# Altium integrated library BS_Altium_Lib.IntLib: 1016 symbols (part 8 of 8)
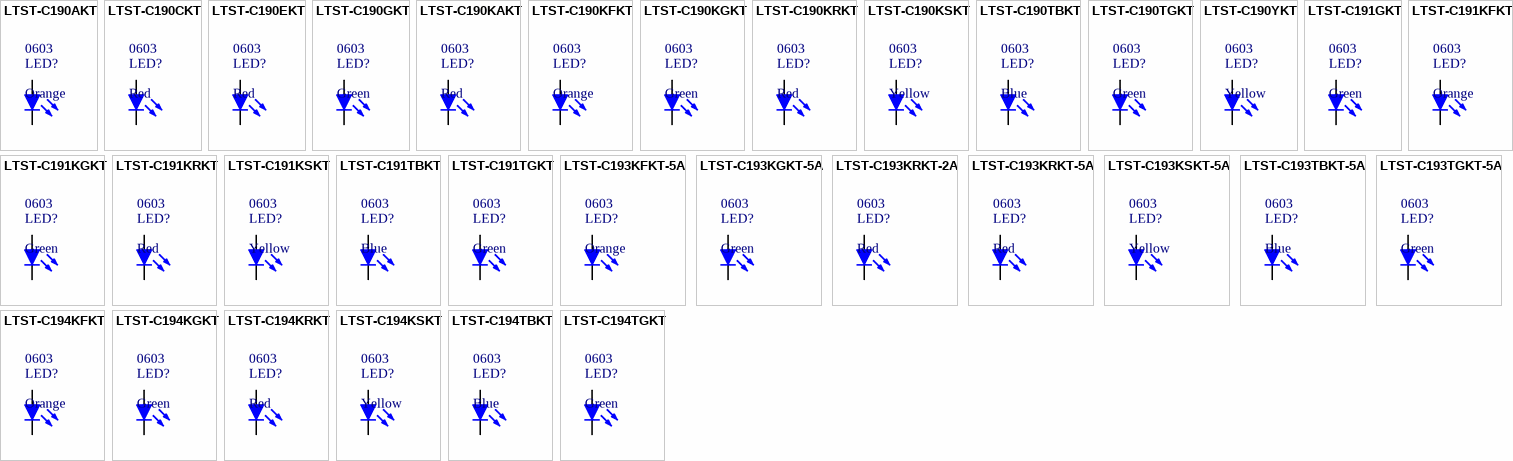
[diagram p66: symbols LTST-C190AKT to LTST-C194TGKT]

## LTST-C193KGKT-5A
designator LED?, comment Green  Package: 0603
LED GREEN CLEAR 0603 SMD; Manufacturer: Lite-On Inc.; Manufacturer Part Number: LTST-C193KGKT-5A; Lens Color: Colorless; Millicandela Rating: 16.25mcd; Lens Style/Size: Rectangle with Flat Top, 1.15mm x 0.80mm; Voltage - Forward (Vf) (Typ): 2V; Current - Test: 5mA; Viewing Angle: 130°; Wavelength - Dominant: 572nm; Wavelength - Peak: 574nm; Supplier 1: Digi-Key; Supplier Part Number 1: 160-1828-1-ND; RoHS: RoHS Compliant; Category: Optoelectronics; Stock 1: 152539; Pricing 1: 1=0.41, 10=0.296, 25=0.2268, 100=0.148, 250=0.10852, 500=0.0921, 1000=0.07565 (USD); Packaging: Cut Tape (CT); Part Status: Active; Color: Green; Lens Transparency: Clear; Mounting Type: Surface Mount; Features: -; Supplier Device Package: Chip LED; Size / Dimension: 1.60mm L x 0.80mm W; Height (Max): 0.45mm; ComponentLink1URL: http://optoelectronics.liteon.com/upload/download/DS22-2007-0094/S_110_LTST-C193KGKT-5A.pdf; ComponentLink1Description: http://optoelectronics.liteon.com/upload/download/DS22-2007-0094/S_110_LTST-C193KGKT-5A.pdf
footprint Led 0603 - green (Led SMD 0603)
pins: 1 A, 2 K

## LTST-C193KRKT-2A
designator LED?, comment Red  Package: 0603
LED RED CLEAR 0603 SMD; Manufacturer: Lite-On Inc.; Manufacturer Part Number: LTST-C193KRKT-2A; Lens Color: Colorless; Millicandela Rating: 6.5mcd; Lens Style/Size: Rectangle with Flat Top, 1.15mm x 0.80mm; Voltage - Forward (Vf) (Typ): 1.9V; Current - Test: 2mA; Viewing Angle: 130°; Wavelength - Dominant: 629nm; Wavelength - Peak: 639nm; Supplier 1: Digi-Key; Supplier Part Number 1: 160-1909-1-ND; RoHS: RoHS Compliant; Category: Optoelectronics; Stock 1: 12161; Pricing 1: 1=0.51, 10=0.366, 25=0.2808, 100=0.1832, 250=0.13432, 500=0.11396, 1000=0.09361 (USD); Packaging: Cut Tape (CT); Part Status: Active; Color: Red; Lens Transparency: Clear; Mounting Type: Surface Mount; Features: -; Supplier Device Package: Chip LED; Size / Dimension: 1.60mm L x 0.80mm W; Height (Max): 0.35mm; ComponentLink1URL: http://media.digikey.com/pdf/Data%20Sheets/Lite-On%20PDFs/LTST-C193KRKT-2A.pdf; ComponentLink1Description: http://media.digikey.com/pdf/Data%20Sheets/Lite-On%20PDFs/LTST-C193KRKT-2A.pdf
footprint Led 0603 - red (Led SMD 0603)
pins: 1 A, 2 K

## LTST-C193KRKT-5A
designator LED?, comment Red  Package: 0603
LED RED CLEAR 0603 SMD; Manufacturer: Lite-On Inc.; Manufacturer Part Number: LTST-C193KRKT-5A; Lens Color: Colorless; Millicandela Rating: 26.05mcd; Lens Style/Size: Rectangle with Flat Top, 1.15mm x 0.80mm; Voltage - Forward (Vf) (Typ): 2V; Current - Test: 5mA; Viewing Angle: 130°; Wavelength - Dominant: 631nm; Wavelength - Peak: 639nm; Supplier 1: Digi-Key; Supplier Part Number 1: 160-1830-1-ND; RoHS: RoHS Compliant; Category: Optoelectronics; Stock 1: 88243; Pricing 1: 1=0.41, 10=0.296, 25=0.2268, 100=0.148, 250=0.10852, 500=0.0921, 1000=0.07565 (USD); Packaging: Cut Tape (CT); Part Status: Active; Color: Red; Lens Transparency: Clear; Mounting Type: Surface Mount; Features: -; Supplier Device Package: Chip LED; Size / Dimension: 1.60mm L x 0.80mm W; Height (Max): 0.45mm; ComponentLink1URL: http://optoelectronics.liteon.com/upload/download/DS22-2005-077/S_110_LTST-C193KRKT-5A.pdf; ComponentLink1Description: http://optoelectronics.liteon.com/upload/download/DS22-2005-077/S_110_LTST-C193KRKT-5A.pdf
footprint Led 0603 - red (Led SMD 0603)
pins: 1 A, 2 K

## LTST-C193KSKT-5A
designator LED?, comment Yellow  Package: 0603
LED YELLOW CLEAR 0603 SMD; Manufacturer: Lite-On Inc.; Manufacturer Part Number: LTST-C193KSKT-5A; Lens Color: Colorless; Millicandela Rating: 26.05mcd; Lens Style/Size: Rectangle with Flat Top, 1.15mm x 0.80mm; Voltage - Forward (Vf) (Typ): 2V; Current - Test: 5mA; Viewing Angle: 130°; Wavelength - Dominant: 591nm; Supplier 1: Digi-Key; Supplier Part Number 1: 160-1831-1-ND; RoHS: RoHS Compliant; Category: Optoelectronics; Stock 1: 43558; Pricing 1: 1=0.41, 10=0.296, 25=0.2268, 100=0.148, 250=0.10852, 500=0.0921, 1000=0.07565 (USD); Packaging: Cut Tape (CT); Part Status: Active; Color: Yellow; Lens Transparency: Clear; Mounting Type: Surface Mount; Wavelength - Peak: 591nm; Features: -; Supplier Device Package: Chip LED; Size / Dimension: 1.60mm L x 0.80mm W; Height (Max): 0.45mm; ComponentLink1URL: http://optoelectronics.liteon.com/upload/download/DS22-2004-141/S_110_LTST-C193KSKT-5A.pdf; ComponentLink1Description: http://optoelectronics.liteon.com/upload/download/DS22-2004-141/S_110_LTST-C193KSKT-5A.pdf
footprint Led 0603 - yellow (Led SMD 0603)
pins: 1 A, 2 K

## LTST-C193TBKT-5A
designator LED?, comment Blue  Package: 0603
LED BLUE CLEAR 0603 SMD; Manufacturer: Lite-On Inc.; Manufacturer Part Number: LTST-C193TBKT-5A; Lens Color: Colorless; Millicandela Rating: 15mcd; Lens Style/Size: Rectangle with Flat Top, 1.15mm x 0.80mm; Voltage - Forward (Vf) (Typ): 2.8V; Current - Test: 5mA; Viewing Angle: 130°; Wavelength - Dominant: 470nm; Wavelength - Peak: 468nm; Supplier 1: Digi-Key; Supplier Part Number 1: 160-1827-1-ND; RoHS: RoHS Compliant; Category: Optoelectronics; Stock 1: 636289; Pricing 1: 1=0.47, 10=0.336, 25=0.2572, 100=0.1678, 250=0.12304, 500=0.10442, 1000=0.08577 (USD); Packaging: Cut Tape (CT); Part Status: Active; Color: Blue; Lens Transparency: Clear; Mounting Type: Surface Mount; Features: -; Supplier Device Package: Chip LED; Size / Dimension: 1.60mm L x 0.80mm W; Height (Max): 0.45mm; ComponentLink1URL: http://optoelectronics.liteon.com/upload/download/DS22-2004-060/P_100_LTST-C193TBKT-5A.pdf; ComponentLink1Description: http://optoelectronics.liteon.com/upload/download/DS22-2004-060/P_100_LTST-C193TBKT-5A.pdf
footprint Led 0603 - blue (Led SMD 0603)
pins: 1 A, 2 K

## LTST-C193TGKT-5A
designator LED?, comment Green  Package: 0603
LED GREEN CLEAR 0603 SMD; Manufacturer: Lite-On Inc.; Manufacturer Part Number: LTST-C193TGKT-5A; Lens Color: Colorless; Millicandela Rating: 154mcd; Lens Style/Size: Rectangle with Flat Top, 1.15mm x 0.80mm; Voltage - Forward (Vf) (Typ): 2.8V; Current - Test: 5mA; Viewing Angle: 130°; Wavelength - Dominant: 528nm; Wavelength - Peak: 525nm; Supplier 1: Digi-Key; Supplier Part Number 1: 160-1832-1-ND; RoHS: RoHS Compliant; Category: Optoelectronics; Stock 1: 80659; Pricing 1: 1=0.51, 10=0.37, 25=0.302, 100=0.2415, 250=0.20376, 500=0.17356, 1000=0.13583 (USD); Packaging: Cut Tape (CT); Part Status: Active; Color: Green; Lens Transparency: Clear; Mounting Type: Surface Mount; Features: -; Supplier Device Package: Chip LED; Size / Dimension: 1.60mm L x 0.80mm W; Height (Max): 0.45mm; ComponentLink1URL: http://optoelectronics.liteon.com/upload/download/DS22-2004-186/P_100_LTST-C193TGKT-5A.pdf; ComponentLink1Description: http://optoelectronics.liteon.com/upload/download/DS22-2004-186/P_100_LTST-C193TGKT-5A.pdf
footprint Led 0603 - green (Led SMD 0603)
pins: 1 A, 2 K

## LTST-C194KFKT
designator LED?, comment Orange  Package: 0603
LED ORANGE CLEAR 0603 SMD; Manufacturer: Lite-On Inc.; Manufacturer Part Number: LTST-C194KFKT; Lens Color: Colorless; Millicandela Rating: 162.5mcd; Lens Style/Size: Rectangle with Flat Top, 1.15mm x 0.80mm; Voltage - Forward (Vf) (Typ): 2V; Current - Test: 20mA; Viewing Angle: 130°; Wavelength - Dominant: 605nm; Wavelength - Peak: 611nm; Supplier 1: Digi-Key; Supplier Part Number 1: 160-1833-1-ND; RoHS: RoHS Compliant; Category: Optoelectronics; Stock 1: 32905; Pricing 1: 1=0.41, 10=0.296, 25=0.2268, 100=0.148, 250=0.10852, 500=0.0921, 1000=0.07565 (USD); Packaging: Cut Tape (CT); Part Status: Active; Color: Orange; Lens Transparency: Clear; Mounting Type: Surface Mount; Features: -; Size / Dimension: 1.60mm L x 0.80mm W; Height (Max): 0.45mm; ComponentLink1URL: http://optoelectronics.liteon.com/upload/download/DS22-2010-0196/S_110_LTST-C194KFKT.pdf; ComponentLink1Description: http://optoelectronics.liteon.com/upload/download/DS22-2010-0196/S_110_LTST-C194KFKT.pdf
footprint Led 0603 - orange (Led SMD 0603)
pins: 1 A, 2 K

## LTST-C194KGKT
designator LED?, comment Green  Package: 0603
LED GREEN CLEAR 0603 SMD; Manufacturer: Lite-On Inc.; Manufacturer Part Number: LTST-C194KGKT; Lens Color: Colorless; Millicandela Rating: 65mcd; Lens Style/Size: Rectangle with Flat Top, 1.15mm x 0.80mm; Voltage - Forward (Vf) (Typ): 2.1V; Current - Test: 20mA; Viewing Angle: 130°; Wavelength - Dominant: 572nm; Wavelength - Peak: 574nm; Supplier 1: Digi-Key; Supplier Part Number 1: 160-1834-1-ND; RoHS: RoHS Compliant; Category: Optoelectronics; Stock 1: 34911; Pricing 1: 1=0.41, 10=0.296, 25=0.2268, 100=0.148, 250=0.10852, 500=0.0921, 1000=0.07565 (USD); Packaging: Cut Tape (CT); Part Status: Active; Color: Green; Lens Transparency: Clear; Mounting Type: Surface Mount; Features: -; Size / Dimension: 1.60mm L x 0.80mm W; Height (Max): 0.45mm; ComponentLink1URL: http://optoelectronics.liteon.com/upload/download/DS22-2010-0197/S_110_LTST-C194KGKT.pdf; ComponentLink1Description: http://optoelectronics.liteon.com/upload/download/DS22-2010-0197/S_110_LTST-C194KGKT.pdf
footprint Led 0603 - green (Led SMD 0603)
pins: 1 A, 2 K

## LTST-C194KRKT
designator LED?, comment Red  Package: 0603
LED RED CLEAR 0603 SMD; Manufacturer: Lite-On Inc.; Manufacturer Part Number: LTST-C194KRKT; Lens Color: Colorless; Millicandela Rating: 95.6mcd; Lens Style/Size: Rectangle with Flat Top, 1.15mm x 0.80mm; Voltage - Forward (Vf) (Typ): 2V; Current - Test: 20mA; Viewing Angle: 130°; Wavelength - Dominant: 631nm; Wavelength - Peak: 639nm; Supplier 1: Digi-Key; Supplier Part Number 1: 160-1835-1-ND; RoHS: RoHS Compliant; Category: Optoelectronics; Stock 1: 44539; Pricing 1: 1=0.41, 10=0.296, 25=0.2268, 100=0.148, 250=0.10852, 500=0.0921, 1000=0.07565 (USD); Packaging: Cut Tape (CT); Part Status: Active; Color: Red; Lens Transparency: Clear; Mounting Type: Surface Mount; Features: -; Size / Dimension: 1.60mm L x 0.80mm W; Height (Max): 0.45mm; ComponentLink1URL: http://optoelectronics.liteon.com/upload/download/DS22-2010-0195/S_110_LTST-C194KRKT.pdf; ComponentLink1Description: http://optoelectronics.liteon.com/upload/download/DS22-2010-0195/S_110_LTST-C194KRKT.pdf
footprint Led 0603 - red (Led SMD 0603)
pins: 1 A, 2 K

## LTST-C194KSKT
designator LED?, comment Yellow  Package: 0603
LED YELLOW CLEAR 0603 SMD; Manufacturer: Lite-On Inc.; Manufacturer Part Number: LTST-C194KSKT; Lens Color: Colorless; Millicandela Rating: 104mcd; Lens Style/Size: Rectangle with Flat Top, 1.15mm x 0.80mm; Voltage - Forward (Vf) (Typ): 2V; Current - Test: 20mA; Viewing Angle: 130°; Wavelength - Dominant: 592nm; Wavelength - Peak: 588nm; Supplier 1: Digi-Key; Supplier Part Number 1: 160-1836-1-ND; RoHS: RoHS Compliant; Category: Optoelectronics; Stock 1: 12944; Pricing 1: 1=0.41, 10=0.296, 25=0.2268, 100=0.148, 250=0.10852, 500=0.0921, 1000=0.07565 (USD); Packaging: Cut Tape (CT); Part Status: Active; Color: Yellow; Lens Transparency: Clear; Mounting Type: Surface Mount; Features: -; Size / Dimension: 1.60mm L x 0.80mm W; Height (Max): 0.45mm; ComponentLink1URL: http://optoelectronics.liteon.com/upload/download/DS22-2006-114/S_110_LTST-C194KSKT.pdf; ComponentLink1Description: http://optoelectronics.liteon.com/upload/download/DS22-2006-114/S_110_LTST-C194KSKT.pdf
footprint Led 0603 - yellow (Led SMD 0603)
pins: 1 A, 2 K

## LTST-C194TBKT
designator LED?, comment Blue  Package: 0603
LED BLUE CLEAR 0603 SMD; Manufacturer: Lite-On Inc.; Manufacturer Part Number: LTST-C194TBKT; Lens Color: Colorless; Millicandela Rating: 104mcd; Lens Style/Size: Rectangle with Flat Top, 1.15mm x 0.80mm; Voltage - Forward (Vf) (Typ): 3.3V; Current - Test: 20mA; Viewing Angle: 130°; Wavelength - Dominant: 468nm; Supplier 1: Digi-Key; Supplier Part Number 1: 160-1837-1-ND; RoHS: RoHS Compliant; Category: Optoelectronics; Stock 1: 101348; Pricing 1: 1=0.47, 10=0.336, 25=0.2572, 100=0.1678, 250=0.12304, 500=0.10442, 1000=0.08577 (USD); Packaging: Cut Tape (CT); Part Status: Active; Color: Blue; Lens Transparency: Clear; Mounting Type: Surface Mount; Wavelength - Peak: 468nm; Features: -; Size / Dimension: 1.60mm L x 0.80mm W; Height (Max): 0.45mm; ComponentLink1URL: http://optoelectronics.liteon.com/upload/download/DS22-2010-0025/S_110_LTST-C194TBKT.pdf; ComponentLink1Description: http://optoelectronics.liteon.com/upload/download/DS22-2010-0025/S_110_LTST-C194TBKT.pdf
footprint Led 0603 - blue (Led SMD 0603)
pins: 1 A, 2 K

## LTST-C194TGKT
designator LED?, comment Green  Package: 0603
LED GREEN CLEAR 0603 SMD; Manufacturer: Lite-On Inc.; Manufacturer Part Number: LTST-C194TGKT; Lens Color: Colorless; Millicandela Rating: 260.5mcd; Lens Style/Size: Rectangle with Flat Top, 1.15mm x 0.80mm; Voltage - Forward (Vf) (Typ): 3.2V; Current - Test: 20mA; Viewing Angle: 130°; Wavelength - Dominant: 525nm; Wavelength - Peak: 530nm; Supplier 1: Digi-Key; Supplier Part Number 1: 160-1838-1-ND; RoHS: RoHS Compliant; Category: Optoelectronics; Stock 1: 19301; Pricing 1: 1=0.51, 10=0.37, 25=0.302, 100=0.2415, 250=0.20376, 500=0.17356, 1000=0.13583 (USD); Packaging: Cut Tape (CT); Part Status: Active; Color: Green; Lens Transparency: Clear; Mounting Type: Surface Mount; Features: -; Size / Dimension: 1.60mm L x 0.80mm W; Height (Max): 0.45mm; ComponentLink1URL: http://optoelectronics.liteon.com/upload/download/DS22-2010-0023/S_110_LTST-C194TGKT.pdf; ComponentLink1Description: http://optoelectronics.liteon.com/upload/download/DS22-2010-0023/S_110_LTST-C194TGKT.pdf
footprint Led 0603 - green (Led SMD 0603)
pins: 1 A, 2 K


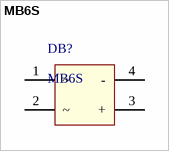
[diagram p48: symbol MB6S]

## MB6S
designator DB?
IC RECT BRIDGE 0.5A 600V 4SOIC; Manufacturer: Fairchild Semiconductor; Diode Type: Single Phase; Current - DC Forward (If) (Max): 500mA; Max Surge Current: 35 A; Ir - Reverse Current: 5 uA; Pd - Power Dissipation: 1.4 W; Vf - Forward Voltage: 1 V; Vr - Reverse Voltage: 420 V; Supplier 1: Digi-Key; Manufacturer Part Number: MB6S; RoHS: RoHS Compliant; Category: Discrete Semiconductor Products; Stock 1: 21407; Pricing 1: 1=0.38, 10=0.305, 100=0.2079, 500=0.15562, 1000=0.11655 (USD); Packaging: Cut Tape (CT); Part Status: Active; Voltage - Peak Reverse (Max): 600V; Mounting Type: Surface Mount; Package / Case: TO-269AA, 4-BESOP; Operating Temperature: -55°C ~ 150°C (TJ); Supplier Device Package: 4-SOIC; ComponentLink1URL: https://www.fairchildsemi.com/datasheets/MB/MB1S.pdf; ComponentLink1Description: https://www.fairchildsemi.com/datasheets/MB/MB1S.pdf; Supplier 2: Mouser; Stock 2: 17482; Pricing 2: 1=0.360, 10=0.279, 100=0.151, 1000=0.113, 3000=0.098, 9000=0.091, 24000=0.084, 45000=0.080, 99000=0.076 (USD); Height: 2.7 mm; Length: 4.9 mm; Product: Bridge Rectifiers; Series: MB6S; Termination Style: SMD/SMT; Type: Single Phase Bridge; Width: 4.2 mm; Brand: Fairchild Semiconductor; Mounting Style: PCB Mount; If - Forward Current: 0.5 A; Maximum Operating Temperature: + 150 C; Minimum Operating Temperature: - 55 C; Peak Reverse Voltage: 600 V; Standard Pack Qty: 3000; RoHS - Mouser: E; Minimum Order Quantity: 1; Reeling: True; ComponentLink2URL: http://www.mouser.com/ds/2/149/MB6S-1011197.pdf; ComponentLink2Description: http://www.mouser.com/ds/2/149/MB6S-1011197.pdf; Supplier Part Number 1: MB6SCT-ND; Supplier Part Number 2: 512-MB6S
footprint SOIC-4 DB (SOIC-4 Diodes Bridge)
pins: 1 ~, 2 ~, 3 +, 4 -


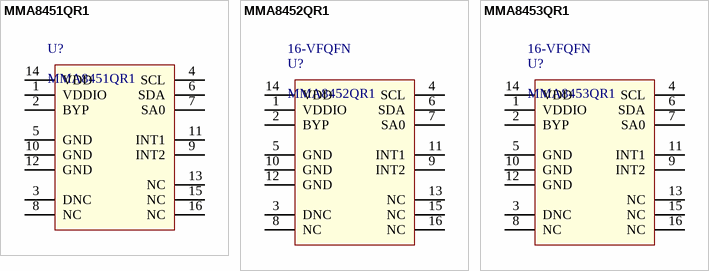
[diagram p49: symbols MMA8451QR1 to MMA8453QR1]

## MMA8451QR1
designator U?
ACCELEROMETER 2-8G I2C 16QFN; Manufacturer: NXP USA Inc.; Axis: X, Y, Z; Acceleration Range: ±2g, 4g, 8g; Sensitivity (LSB/g): 4096 (±2g) ~ 1024 (±8g); Bandwidth: 0.78Hz ~ 400Hz; Output Type: I²C; Voltage - Supply: 1.95 V ~ 3.6 V; Supplier 1: Digi-Key; Supplier Part Number 1: MMA8451QR1CT-ND; Manufacturer Part Number: MMA8451QR1; RoHS: RoHS Compliant; Category: Sensors, Transducers; Stock 1: 45561; Pricing 1: 1=2.65, 5=2.502, 10=2.145, 25=1.716, 50=1.573, 100=1.43, 500=1.25126 (USD); Packaging: Cut Tape (CT); Part Status: Active; Type: Digital; Sensitivity (mV/g): -; Features: Adjustable Bandwidth, Selectable Scale, Sleep Mode; Operating Temperature: -40°C ~ 85°C (TA); Mounting Type: Surface Mount; Supplier Device Package: 16-QFN (3x3); ComponentLink1URL: http://cache.freescale.com/files/sensors/doc/data_sheet/MMA8451Q.pdf; ComponentLink1Description: http://cache.freescale.com/files/sensors/doc/data_sheet/MMA8451Q.pdf; Package: 16-VFQFN
footprint QFN-16 MMA845xQ (QFN, 16-Leads, Body 3.0x3.0mm (max), Pitch 0.50mm, IPC Low Density)
pins: 1 VDDIO "Internal power supply (1.62 V to 3.6 V)", 2 BYP "Bypass capacitor (0.1 mF)", 3 DNC "Do not connect to anything, leave pin isolated and floating.", 4 SCL "I2C serial clock, open drain", 5 GND "Connect to ground", 6 SDA "I2C serial data", 7 SA0 "I2C least significant bit of the device I2C address, I2C 7-bit address = 0x1C (SA0 = 0), 0x1D (SA0 = 1).", 8 NC "Internally not connected", 9 INT2 "Inertial interrupt 2, output pin", 10 GND "Connect to ground", 11 INT1 "Inertial interrupt 1, output pin", 12 GND "Connect to ground", 13 NC "Internally not connected", 14 VDD "Power supply (1.95 V to 3.6 V)", 15 NC "Internally not connected", 16 NC "Internally not connected (can be GND or VDD)"

## MMA8452QR1
designator U?  Package: 16-VFQFN
ACCELEROMETER 2-8G I2C 16QFN; Manufacturer: NXP USA Inc.; Axis: X, Y, Z; Acceleration Range: ±2g, 4g, 8g; Sensitivity (LSB/g): 1024 (±2g) ~ 256 (±8g); Bandwidth: 0.78Hz ~ 400Hz; Output Type: I²C; Voltage - Supply: 1.95 V ~ 3.6 V; Supplier 1: Digi-Key; Supplier Part Number 1: MMA8452QR1CT-ND; Manufacturer Part Number: MMA8452QR1; RoHS: RoHS Compliant; Category: Sensors, Transducers; Stock 1: 40000; Pricing 1: 1=2.08, 5=1.964, 10=1.683, 25=1.3464, 50=1.2342, 100=1.122, 500=0.98176 (USD); Packaging: Cut Tape (CT); Part Status: Active; Type: Digital; Sensitivity (mV/g): -; Features: Adjustable Bandwidth, Selectable Scale, Sleep Mode; Operating Temperature: -40°C ~ 85°C (TA); Mounting Type: Surface Mount; Supplier Device Package: 16-QFN (3x3); ComponentLink1URL: http://cache.freescale.com/files/sensors/doc/data_sheet/MMA8452Q.pdf; ComponentLink1Description: http://cache.freescale.com/files/sensors/doc/data_sheet/MMA8452Q.pdf
footprint QFN-16 MMA845xQ (QFN, 16-Leads, Body 3.0x3.0mm (max), Pitch 0.50mm, IPC Low Density)
pins: 1 VDDIO "Internal power supply (1.62 V to 3.6 V)", 2 BYP "Bypass capacitor (0.1 mF)", 3 DNC "Do not connect to anything, leave pin isolated and floating.", 4 SCL "I2C serial clock, open drain", 5 GND "Connect to ground", 6 SDA "I2C serial data", 7 SA0 "I2C least significant bit of the device I2C address, I2C 7-bit address = 0x1C (SA0 = 0), 0x1D (SA0 = 1).", 8 NC "Internally not connected", 9 INT2 "Inertial interrupt 2, output pin", 10 GND "Connect to ground", 11 INT1 "Inertial interrupt 1, output pin", 12 GND "Connect to ground", 13 NC "Internally not connected", 14 VDD "Power supply (1.95 V to 3.6 V)", 15 NC "Internally not connected", 16 NC "Internally not connected (can be GND or VDD)"

## MMA8453QR1
designator U?  Package: 16-VFQFN
ACCELEROMETER 2-8G I2C 16QFN; Manufacturer: NXP USA Inc.; Axis: X, Y, Z; Acceleration Range: ±2g, 4g, 8g; Sensitivity (LSB/g): 256 (±2g) ~ 64 (±8g); Bandwidth: 0.78Hz ~ 400Hz; Output Type: I²C; Voltage - Supply: 1.95 V ~ 3.6 V; Supplier 1: Digi-Key; Supplier Part Number 1: MMA8453QR1CT-ND; Manufacturer Part Number: MMA8453QR1; RoHS: RoHS Compliant; Category: Sensors, Transducers; Stock 1: 8975; Pricing 1: 1=2.08, 5=1.964, 10=1.683, 25=1.3464, 50=1.2342, 100=1.122, 500=0.98176 (USD); Packaging: Cut Tape (CT); Part Status: Active; Type: Digital; Sensitivity (mV/g): -; Features: Adjustable Bandwidth, Selectable Scale, Sleep Mode; Operating Temperature: -40°C ~ 85°C (TA); Mounting Type: Surface Mount; Supplier Device Package: 16-QFN (3x3); ComponentLink1URL: http://cache.freescale.com/files/sensors/doc/data_sheet/MMA8453Q.pdf; ComponentLink1Description: http://cache.freescale.com/files/sensors/doc/data_sheet/MMA8453Q.pdf
footprint QFN-16 MMA845xQ (QFN, 16-Leads, Body 3.0x3.0mm (max), Pitch 0.50mm, IPC Low Density)
pins: 1 VDDIO "Internal power supply (1.62 V to 3.6 V)", 2 BYP "Bypass capacitor (0.1 mF)", 3 DNC "Do not connect to anything, leave pin isolated and floating.", 4 SCL "I2C serial clock, open drain", 5 GND "Connect to ground", 6 SDA "I2C serial data", 7 SA0 "I2C least significant bit of the device I2C address, I2C 7-bit address = 0x1C (SA0 = 0), 0x1D (SA0 = 1).", 8 NC "Internally not connected", 9 INT2 "Inertial interrupt 2, output pin", 10 GND "Connect to ground", 11 INT1 "Inertial interrupt 1, output pin", 12 GND "Connect to ground", 13 NC "Internally not connected", 14 VDD "Power supply (1.95 V to 3.6 V)", 15 NC "Internally not connected", 16 NC "Internally not connected (can be GND or VDD)"


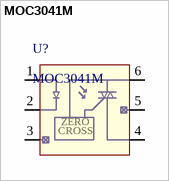
[diagram p50: symbol MOC3041M]

## MOC3041M
designator U?
OPTOISOLATOR 4.17KV TRIAC 6DIP; Manufacturer: ON Semiconductor/Fairchild; Zero Crossing Circuit: Yes; Number of Channels: 1; Voltage - Isolation: 4170Vrms; Voltage - Off State: 400V; Static dV/dt (Min): 1kV/µs; Current - LED Trigger (Ift) (Max): 15mA; Current - Hold (Ih): 400µA (Typ); Voltage - Forward (Vf) (Typ): 1.25V; Current - DC Forward (If) (Max): 60mA; Approvals: UL; Supplier 1: Digi-Key; Supplier Part Number 1: MOC3041M-ND; Manufacturer Part Number: MOC3041M; RoHS: RoHS Compliant; Category: Isolators; Stock 1: 5774; Pricing 1: 1=0.95, 10=0.735, 25=0.6092, 100=0.525, 250=0.462, 500=0.399, 1000=0.315, 2500=0.294, 5000=0.2835 (USD); Packaging: Tube; Part Status: Active; Output Type: Triac; Current - On State (It (RMS)) (Max): -; Turn On Time: -; Operating Temperature: -40°C ~ 85°C; Mounting Type: Through Hole; Package / Case: 6-DIP (0.300", 7.62mm); Supplier Device Package: 6-DIP; ComponentLink1URL: https://www.fairchildsemi.com/datasheets/MO/MOC3042M.pdf; ComponentLink1Description: https://www.fairchildsemi.com/datasheets/MO/MOC3042M.pdf; Supplier 2: Mouser; Supplier Part Number 2: 512-MOC3041-M
footprint DIP-6 White
pins: 1 A, 2 K, 3 NC, 4 T2, 5 NC, 6 T1
text: ZERO; CROSS


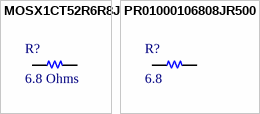
[diagram p51: symbols MOSX1CT52R6R8J to PR01000106808JR500]

## MOSX1CT52R6R8J
designator R?, comment 6.8 Ohms
Metal Oxide Resistors RSS1 6.8 5%TR; Manufacturer: KOA Speer; Manufacturer Part Number: MOSX1CT52R6R8J; Power Rating: 1 W; Temperature Coefficient: 300 PPM / C; Tolerance: 5 %; Qualification: AEC-Q200; Supplier 1: Mouser; Supplier Part Number 1: 660-MOSX1CT52R6R8J; RoHS: RoHS Compliant; Category: Metal Oxide Resistors; Stock 1: 7005; Pricing 1: 1=0.100, 50=0.082, 100=0.075, 500=0.063, 1000=0.056, 4000=0.049, 8000=0.046, 12000=0.040, 20000=0.035 (USD); Diameter: 3 mm; Length: 9 mm; Operating Temperature Range: - 55 C to + 200 C; Packaging: Reel; Product: Power Resistors Metal Oxide; Resistance: 6.8 Ohms; Series: MOS; Termination Style: Axial; Brand: KOA Speer; Standard Pack Qty: 4000; RoHS - Mouser: Y; Minimum Order Quantity: 1; Reeling: True; ComponentLink1URL: http://www.mouser.com/ds/2/219/MOS-16613.pdf; ComponentLink1Description: http://www.mouser.com/ds/2/219/MOS-16613.pdf
footprint Axial_D3.4mm_P4.0mm_straight (Resistors, Axial, , Length 6.5 mm, Diameter 2.5 mm)
pins: 1, 2

## PR01000106808JR500
designator R?, comment 6.8
RES 6.8 OHM 1W 5% AXIAL; Manufacturer: Vishay BC Components; Manufacturer Part Number: PR01000106808JR500; Temperature Coefficient: ±250ppm/°C; Resistance: 6.8 Ohms; Voltage Rating: 350 V; Brand: Vishay / BC Components; Lead Diameter: 0.58 mm; Supplier 1: Digi-Key; RoHS: RoHS Compliant; Category: Resistors; Stock 1: 2328; Pricing 1: 1=0.24, 10=0.206, 25=0.1496, 50=0.1084, 100=0.0804, 250=0.06172, 500=0.04862, 1000=0.03366, 2500=0.03086 (USD); Packaging: Cut Tape (CT); Part Status: Active; Resistance (Ohms): 6.8; Tolerance: ±5%; Power (Watts): 1W; Composition: Metal Film; Features: Automotive AEC-Q200, Flame Retardant Coating, Safety; Operating Temperature: -55°C ~ 155°C; Package / Case: Axial; Supplier Device Package: Axial; Size / Dimension: 0.098" Dia x 0.256" L (2.50mm x 6.50mm); Height: -; Number of Terminations: 2; Failure Rate: -; ComponentLink1URL: http://www.vishay.com/docs/28729/pr010203.pdf; ComponentLink1Description: http://www.vishay.com/docs/28729/pr010203.pdf; Supplier 2: Mouser; Stock 2: 532; Pricing 2: 1=0.180, 100=0.110, 500=0.063, 1000=0.044, 5000=0.025, 10000=0.024, 25000=0.023, 50000=0.022 (USD); Diameter: 2.5 mm; Length: 6.5 mm; Operating Temperature Range: - 55 C to + 155 C; Power Rating: 1 W; Product: Metal Film Resistors - Through Hole; Series: 5073; Termination Style: Axial; Type: Power Metal Film Leaded Resistors; Lead Spacing: -; Standard Pack Qty: 5000; RoHS - Mouser: Y; Minimum Order Quantity: 1; Reeling: True; ComponentLink2URL: http://www.mouser.com/ds/2/427/pr010203-239785.pdf; ComponentLink2Description: http://www.mouser.com/ds/2/427/pr010203-239785.pdf; Supplier Part Number 1: PPC6.8W-1CT-ND; Supplier Part Number 2: 594-5073NW6R800J
footprint Axial_D3.4mm_P4.0mm_straight (Resistors, Axial, , Length 6.5 mm, Diameter 2.5 mm)
pins: 1, 2


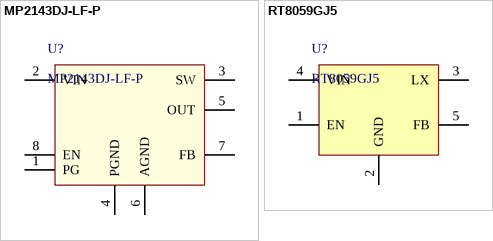
[diagram p52: symbols MP2143DJ-LF-P to RT8059GJ5]

## MP2143DJ-LF-P
designator U?
IC REG BUCK ADJ 3A SYNC; Manufacturer: Monolithic Power Systems Inc.; Function: Step-Down; Output Configuration: Positive; Output Type: Adjustable; Number of Outputs: 1; Voltage - Input (Min): 2.5V; Voltage - Input (Max): 5.5V; Voltage - Output (Min/Fixed): 0.6V; Voltage - Output (Max): 5V; Frequency - Switching: 1.2MHz; Synchronous Rectifier: Yes; Supplier 1: Digi-Key; Supplier Part Number 1: 1589-1080-1-ND; Manufacturer Part Number: MP2143DJ-LF-P; RoHS: RoHS Compliant; Category: Integrated Circuits (ICs); Stock 1: 415; Pricing 1: 1=3.07, 10=2.769, 25=2.472, 100=2.2248, 250=1.9776 (USD); Packaging: Cut Tape (CT); Part Status: Active; Topology: Buck; Current - Output: 3A; Operating Temperature: -40°C ~ 125°C (TJ); Mounting Type: Surface Mount; Supplier Device Package: TSOT-23-8; ComponentLink1URL: https://www.monolithicpower.com/DesktopModules/DocumentManage/API/Document/GetDocument?id=519; ComponentLink1Description: https://www.monolithicpower.com/DesktopModules/DocumentManage/API/Document/GetDocument?id=519; Package: SOT-23-8 Thin, TSOT-23-8
footprint TSOT-23-8
pins: 1 PG "Power-Good Indicator. The pin output is an open drain that connects to VIN by an internal pull-up resistor. PG is pulled up to VIN when the FB voltage is within ±10% of the regulation level. If FB voltage is out of that regulation range, it is LOW.", 2 VIN "Supply Voltage. The MP2143 operates from a 2.5V-to-5.5V unregulated input. C1  prevents large voltage spikes from appearing at the input.", 3 SW "Switch Output", 4 PGND "Power Ground", 5 OUT "Input Sense. For output voltage feedback", 6 AGND "Analog ground. Reference for the internal control circuit.", 7 FB "Feedback pin. Connect an external resistor divider from the output to AGND to set the output voltage.", 8 EN "On/Off Control"

## RT8059GJ5
designator U?
IC REG BUCK ADJ 1A SYNC TSOT23-5; Manufacturer: Richtek USA Inc.; Function: Step-Down; Output Configuration: Positive; Output Type: Adjustable; Number of Outputs: 1; Voltage - Input (Min): 2.8V; Voltage - Input (Max): 5.5V; Voltage - Output (Min/Fixed): 0.6V; Frequency - Switching: 1.5MHz; Synchronous Rectifier: Yes; Supplier 1: Digi-Key; Supplier Part Number 1: 1028-1493-1-ND; Manufacturer Part Number: RT8059GJ5; RoHS: RoHS Compliant; Category: Integrated Circuits (ICs); Stock 1: 2661; Pricing 1: 1=0.92, 10=0.809, 25=0.716, 100=0.6237, 250=0.54284, 500=0.462, 1000=0.3696 (USD); Packaging: Cut Tape (CT); Part Status: Active; Topology: Buck; Voltage - Output (Max): 5.5V; Current - Output: 1A; Operating Temperature: -40°C ~ 85°C (TA); Mounting Type: Surface Mount; Supplier Device Package: TSOT-23-5; ComponentLink1URL: http://www.richtek.com/assets/product_file/RT8059/DS8059-05.pdf; ComponentLink1Description: http://www.richtek.com/assets/product_file/RT8059/DS8059-05.pdf; Package: SOT-23-5 Thin, TSOT-23-5
footprint SOT-23-5 (SOT23, 5-Leads, Body 3.0x3.0mm (max), Pitch 0.95mm, IPC Medium Density)
pins: 1 EN, 2 GND, 3 LX, 4 VIN, 5 FB


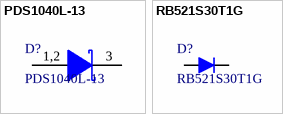
[diagram p53: symbols PDS1040L-13 to RB521S30T1G]

## PDS1040L-13
designator D?
DIODE SCHOTTKY 40V 10A POWERDI5; Manufacturer: Diodes Incorporated; Voltage - Forward (Vf) (Max) @ If: 490mV @ 10A; Speed: Fast Recovery =< 500ns, > 200mA (Io); Current - Reverse Leakage @ Vr: 600µA @ 40V; Configuration: Single Dual Anode; Type: Schottky Barrier Rectifier; Ifsm - Forward Surge Current: 275 A; Ir - Reverse Current: 600 uA; Vf - Forward Voltage: 0.49 V; Supplier 1: Digi-Key; Manufacturer Part Number: PDS1040L-13; RoHS: RoHS Compliant; Category: Discrete Semiconductor Products; Stock 1: 10398; Pricing 1: 1=1.19, 10=1.063, 100=0.8292, 500=0.68496, 1000=0.54075 (USD); Packaging: Cut Tape (CT); Part Status: Active; Diode Type: Schottky; Voltage - DC Reverse (Vr) (Max): 40V; Current - Average Rectified (Io): 10A; Reverse Recovery Time (trr): -; Capacitance @ Vr, F: -; Mounting Type: Surface Mount; Package / Case: PowerDI™ 5; Supplier Device Package: PowerDI™ 5; Operating Temperature - Junction: -65°C ~ 150°C; ComponentLink1URL: http://www.diodes.com/_files/datasheets/ds30486.pdf; ComponentLink1Description: http://www.diodes.com/_files/datasheets/ds30486.pdf; Supplier 2: Mouser; Stock 2: 6289; Pricing 2: 1=1.14, 10=0.980, 100=0.753, 500=0.665, 1000=0.525, 2500=0.464, 5000=0.455, 10000=0.447, 25000=0.419 (USD); Height: 1.15 mm; Length: 4.05 mm; Operating Temperature Range: - 65 C to + 150 C; Product: Schottky Diodes; Series: PDS1040; Technology: Si; Termination Style: SMD/SMT; Width: 5.45 mm; Brand: Diodes Incorporated; Mounting Style: SMD/SMT; If - Forward Current: 10 A; Maximum Operating Temperature: + 150 C; Minimum Operating Temperature: - 65 C; Standard Pack Qty: 5000; Vrrm - Repetitive Reverse Voltage: 40 V; RoHS - Mouser: E; Minimum Order Quantity: 1; Reeling: True; ComponentLink2URL: http://www.mouser.com/ds/2/115/ds30486-62126.pdf; ComponentLink2Description: http://www.mouser.com/ds/2/115/ds30486-62126.pdf; Supplier Part Number 1: PDS1040LDICT-ND; Supplier Part Number 2: 621-PDS1040L-13
footprint SOD Powerdi5 (Diodes Inc recommended land pattern, ap02001.pdf rev 60)
pins: 1 A, 2 A, 3 K
text: 1,2

## RB521S30T1G
designator D?
DIODE SCHOTTKY 30V 200MA SOD523; Manufacturer: ON Semiconductor; Current - Average Rectified (Io): 200mA (DC); Voltage - Forward (Vf) (Max) @ If: 500mV @ 200mA; Speed: Small Signal =< 200mA (Io), Any Speed; Current - Reverse Leakage @ Vr: 30µA @ 10V; Supplier 1: Digi-Key; Supplier Part Number 1: RB521S30T1GOSCT-ND; Manufacturer Part Number: RB521S30T1G; RoHS: RoHS Compliant; Category: Discrete Semiconductor Products; Stock 1: 172098; Pricing 1: 1=0.21, 10=0.189, 100=0.1029, 500=0.0633, 1000=0.04316 (USD); Packaging: Cut Tape (CT); Part Status: Active; Diode Type: Schottky; Voltage - DC Reverse (Vr) (Max): 30V; Reverse Recovery Time (trr): -; Capacitance @ Vr, F: -; Mounting Type: Surface Mount; Supplier Device Package: SOD-523; Operating Temperature - Junction: -55°C ~ 125°C; ComponentLink1URL: http://www.onsemi.com/pub_link/Collateral/RB521S30T1-D.PDF; ComponentLink1Description: http://www.onsemi.com/pub_link/Collateral/RB521S30T1-D.PDF; Package: SC-79, SOD-523
footprint SOD-523 (SC-79, SOD-523)
pins: 1 A, 2 K


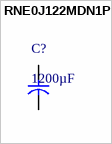
[diagram p54: symbol RNE0J122MDN1PX]

## RNE0J122MDN1PX
designator C?, comment 1200µF
CAP ALUM POLY 1200UF 6.3V T/H; Manufacturer: Nichicon; Manufacturer Part Number: RNE0J122MDN1PX; Type: Polymer; Tolerance: ±20%; ESR (Equivalent Series Resistance): 10 mOhm; Lifetime @ Temp.: 2000 Hrs @ 105°C; Ripple Current: 5.7A; Voltage Rating DC: 6.3 VDC; ESR: 10 mOhms; Leakage Current: 1.512 mA; Dissipation Factor DF: 0.08; Life: 5000 Hour; Supplier 1: Digi-Key; RoHS: RoHS Compliant; Category: Capacitors; Stock 1: 61365; Pricing 1: 1=0.86, 10=0.654, 25=0.5796, 50=0.5434, 100=0.4689, 250=0.42264, 500=0.36226 (USD); Packaging: Cut Tape (CT); Part Status: Active; Capacitance: 1200µF; Voltage Rating: 6.3V; Operating Temperature: -55°C ~ 105°C; Applications: -; Impedance: -; Lead Spacing: 0.197" (5.00mm); Size / Dimension: 0.315" Dia (8.00mm); Height - Seated (Max): 0.354" (9.00mm); Surface Mount Land Size: -; Mounting Type: Through Hole; Package / Case: Radial, Can; ComponentLink1URL: http://nichicon-us.com/english/products/pdfs/e-rne.pdf; ComponentLink1Description: http://nichicon-us.com/english/products/pdfs/e-rne.pdf; Supplier 2: Mouser; Stock 2: 1663; Pricing 2: 1=1.19, 10=0.806, 100=0.530, 500=0.477, 1000=0.328, 2000=0.307, 5000=0.291, 10000=0.281, 25000=0.270 (USD); Diameter: 8 mm; Length: 9 mm; Product: Can; Series: RNE; Termination Style: Radial; Brand: Nichicon; Maximum Operating Temperature: + 105 C; Minimum Operating Temperature: - 55 C; Product Type: Solid Electrolytic Capacitor; Standard Pack Qty: 1000; Tradename: FPCAP; RoHS - Mouser: Y; Minimum Order Quantity: 1; Reeling: True; ComponentLink2URL: http://www.mouser.com/ds/2/293/e-rne-875908.pdf; ComponentLink2Description: http://www.mouser.com/ds/2/293/e-rne-875908.pdf; Supplier Part Number 1: 493-3811-1-ND; Supplier Part Number 2: 647-RNE0J122MDN1PX
footprint CYLN/D080/H090/LS35 (Dia 8mm, Heigh 12.5mm, Lead Space 3mm (4.7uF/400V small))
pins: 1, 2


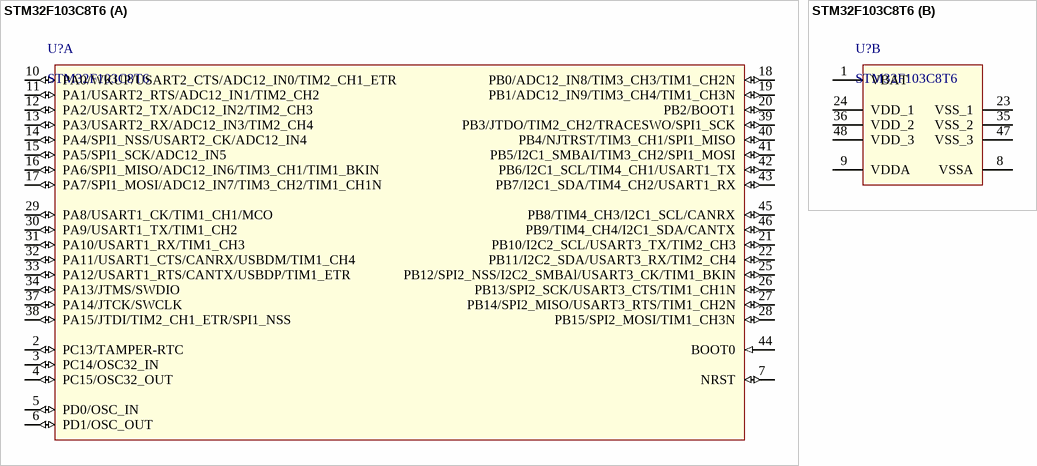
[diagram p55: symbol STM32F103C8T6]

## STM32F103C8T6
designator U?
IC MCU 32BIT 64KB FLASH 48LQFP; Manufacturer: STMicroelectronics; Core Processor: ARM® Cortex®-M3; Core Size: 32-Bit; Speed: 72MHz; Connectivity: CAN, I²C, IrDA, LIN, SPI, UART/USART, USB; Peripherals: DMA, Motor Control PWM, PDR, POR, PVD, PWM, Temp Sensor, WDT; Number of I/O: 37; Program Memory Size: 64KB (64K x 8); RAM Size: 20K x 8; Voltage - Supply (Vcc/Vdd): 2 V ~ 3.6 V; Data Converters: A/D 10x12b; Oscillator Type: Internal; Data RAM Size: 20 kB; Data RAM Type: SRAM; Interface Type: CAN, I2C, SPI, USART, USB; Number of I/Os: 48 I/O; ADC Resolution: 12 bit; Core: ARM Cortex M3; Maximum Clock Frequency: 72 MHz; Number of ADC Channels: 10; Number of Timers/Counters: 3 Timer; Operating Supply Voltage: 2 V to 3.6 V; Processor Series: ARM Cortex M; Supply Voltage - Max: 3.6 V; Supply Voltage - Min: 2 V; Supplier 1: Digi-Key; Supplier Part Number 1: 497-6063-ND; Manufacturer Part Number: STM32F103C8T6; RoHS: RoHS Compliant; Category: Integrated Circuits (ICs); Stock 1: 3616; Pricing 1: 1=6.06, 10=5.438, 100=4.4558, 500=3.7931, 1000=3.199 (USD); Packaging: Tray; Part Status: Active; Program Memory Type: FLASH; EEPROM Size: -; Operating Temperature: -40°C ~ 85°C (TA); Package / Case: 48-LQFP; Supplier Device Package: *; ComponentLink1URL: http://media.digikey.com/pdf/Data%20Sheets/ST%20Microelectronics%20PDFS/STM32F103x8,B.pdf; ComponentLink1Description: http://media.digikey.com/pdf/Data%20Sheets/ST%20Microelectronics%20PDFS/STM32F103x8,B.pdf; Supplier 2: Mouser; Supplier Part Number 2: 511-STM32F103C8T6; Stock 2: 2485; Pricing 2: 1=6.04, 10=5.14, 25=5.05, 100=4.45, 250=4.22, 500=3.76, 1000=3.18, 2500=2.94 (USD); Height: 1.4 mm; Length: 7 mm; Product: MCU; Series: STM32F1; Width: 7 mm; Brand: STMicroelectronics; Mounting Style: SMD/SMT; Data Bus Width: 32 bit; Maximum Operating Temperature: + 85 C; Minimum Operating Temperature: - 40 C; Standard Pack Qty: 250; Tradename: STM32; RoHS - Mouser: Y; Minimum Order Quantity: 1; Reeling: False; ComponentLink2URL: http://www.mouser.com/ds/2/389/stm32f103c8-956229.pdf; ComponentLink2Description: http://www.mouser.com/ds/2/389/stm32f103c8-956229.pdf
footprint LQFP48_L (QFP, 48-Leads, Body 7x7mm, Pitch 0.5mm, IPC High Density)
footprint LQFP48_M (QFP, 48-Leads, Body 7x7mm, Pitch 0.5mm, IPC Low Density)
footprint LQFP48_N (QFP, 48-Leads, Body 7x7mm, Pitch 0.5mm, IPC Medium Density)
part A pins: 2 PC13/TAMPER-RTC (io) "PC13-TAMPER-RTC/PC13/TAMPER-RTC", 3 PC14/OSC32_IN (io) "PC14-OSC32_IN/PC14/OSC32_IN", 4 PC15/OSC32_OUT (io) "PC15-OSC32_OUT/PC15/OSC32_OUT", 5 PD0/OSC_IN (io), 6 PD1/OSC_OUT (io), 7 NRST (io), 10 PA0/WKUP/USART2_CTS/ADC12_IN0/TIM2_CH1_ETR (io) "PA0-WKUP/PA0/WKUP/USART2_CTS/ADC12_IN0/TIM2_CH1_ETR", 11 PA1/USART2_RTS/ADC12_IN1/TIM2_CH2 (io), 12 PA2/USART2_TX/ADC12_IN2/TIM2_CH3 (io), 13 PA3/USART2_RX/ADC12_IN3/TIM2_CH4 (io), 14 PA4/SPI1_NSS/USART2_CK/ADC12_IN4 (io), 15 PA5/SPI1_SCK/ADC12_IN5 (io), 16 PA6/SPI1_MISO/ADC12_IN6/TIM3_CH1/TIM1_BKIN (io), 17 PA7/SPI1_MOSI/ADC12_IN7/TIM3_CH2/TIM1_CH1N (io), 18 PB0/ADC12_IN8/TIM3_CH3/TIM1_CH2N (io), 19 PB1/ADC12_IN9/TIM3_CH4/TIM1_CH3N (io), 20 PB2/BOOT1 (io), 21 PB10/I2C2_SCL/USART3_TX/TIM2_CH3 (io), 22 PB11/I2C2_SDA/USART3_RX/TIM2_CH4 (io), 25 PB12/SPI2_NSS/I2C2_SMBAl/USART3_CK/TIM1_BKIN (io), 26 PB13/SPI2_SCK/USART3_CTS/TIM1_CH1N (io), 27 PB14/SPI2_MISO/USART3_RTS/TIM1_CH2N (io), 28 PB15/SPI2_MOSI/TIM1_CH3N (io), 29 PA8/USART1_CK/TIM1_CH1/MCO (io), 30 PA9/USART1_TX/TIM1_CH2 (io), 31 PA10/USART1_RX/TIM1_CH3 (io), 32 PA11/USART1_CTS/CANRX/USBDM/TIM1_CH4 (io), 33 PA12/USART1_RTS/CANTX/USBDP/TIM1_ETR (io), 34 PA13/JTMS/SWDIO (io), 37 PA14/JTCK/SWCLK (io), 38 PA15/JTDI/TIM2_CH1_ETR/SPI1_NSS (io), 39 PB3/JTDO/TIM2_CH2/TRACESWO/SPI1_SCK (io), 40 PB4/NJTRST/TIM3_CH1/SPI1_MISO (io), 41 PB5/I2C1_SMBAI/TIM3_CH2/SPI1_MOSI (io), 42 PB6/I2C1_SCL/TIM4_CH1/USART1_TX (io), 43 PB7/I2C1_SDA/TIM4_CH2/USART1_RX (io), 44 BOOT0 (in), 45 PB8/TIM4_CH3/I2C1_SCL/CANRX (io), 46 PB9/TIM4_CH4/I2C1_SDA/CANTX (io)
part B pins: 1 VBAT (power), 8 VSSA (power), 9 VDDA (power), 23 VSS_1 (power), 24 VDD_1 (power), 35 VSS_2 (power), 36 VDD_2 (power), 47 VSS_3 (power), 48 VDD_3 (power)


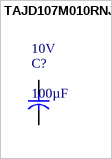
[diagram p56: symbol TAJD107M010RNJ]

## TAJD107M010RNJ
designator C?, comment 100µF  Voltage - Rated: 10V
CAP TANT 100UF 10V 20% 2917; Manufacturer: AVX Corporation; Manufacturer Part Number: TAJD107M010RNJ; Manufacturer Size Code: D; Type: Molded; ESR (Equivalent Series Resistance): 700 mOhm; Supplier 1: Digi-Key; Supplier Part Number 1: 478-3918-1-ND; RoHS: RoHS Compliant; Category: Capacitors; Stock 1: 594; Pricing 1: 1=0.79, 10=0.58, 25=0.4968, 50=0.4636, 100=0.3974, 250=0.36432 (USD); Packaging: Cut Tape (CT); Part Status: Active; Capacitance: 100µF; Tolerance: ±20%; Operating Temperature: -55°C ~ 125°C; Lifetime @ Temp.: -; Mounting Type: Surface Mount; Size / Dimension: 0.287" L x 0.169" W (7.30mm x 4.30mm); Height - Seated (Max): 0.122" (3.10mm); Lead Spacing: -; Features: General Purpose; Failure Rate: -; ComponentLink1URL: http://datasheets.avx.com/TAJ.pdf; ComponentLink1Description: http://datasheets.avx.com/TAJ.pdf; Package: 2917 (7343 Metric)
footprint CTAN-D
pins: 1, 2


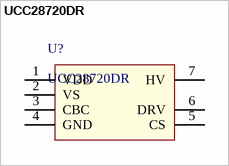
[diagram p57: symbol UCC28720DR]

## UCC28720DR
designator U?
IC REG CTRLR FLYBK ISO 7SOIC; Manufacturer: Texas Instruments; Output Isolation: Isolated; Internal Switch(s): No; Topology: Flyback; Voltage - Start Up: 21V; Voltage - Supply (Vcc/Vdd): 9 V ~ 35 V; Frequency - Switching: 650Hz ~ 80kHz; Fault Protection: Current Limiting, Over Voltage; Duty Cycle - Max: 99 %; Switching Frequency: 0.68 kHz to 80 kHz; Development Kit: UCC28720EVM-212; Operating Supply Voltage: 8.1 V to 35 V; Supplier 1: Digi-Key; Manufacturer Part Number: UCC28720DR; RoHS: RoHS Compliant; Category: Integrated Circuits (ICs); Stock 1: 328; Pricing 1: 1=1.22, 10=1.094, 100=0.8532, 500=0.7056, 1000=0.45 (USD); Packaging: Cut Tape (CT); Part Status: Active; Voltage - Breakdown: -; Duty Cycle: -; Power (Watts): -; Control Features: -; Operating Temperature: -40°C ~ 125°C (TJ); Package / Case: 8-SOIC (0.154", 3.90mm Width) 7 leads; Supplier Device Package: 7-SOIC; Mounting Type: Surface Mount; ComponentLink1URL: http://www.ti.com/lit/ds/symlink/ucc28720.pdf; ComponentLink1Description: http://www.ti.com/lit/ds/symlink/ucc28720.pdf; Supplier 2: Mouser; Stock 2: 2419; Pricing 2: 1=1.18, 10=1.06, 25=0.983, 50=0.882, 100=0.828, 250=0.774, 500=0.684, 1000=0.450, 2500=0.450 (USD); Operating Temperature Range: - 40 C to + 125 C; Series: UCC28720; Type: Current Mode PWM Controllers; Brand: Texas Instruments; Mounting Style: SMD/SMT; Maximum Operating Temperature: + 125 C; Minimum Operating Temperature: - 40 C; Standard Pack Qty: 2500; RoHS - Mouser: Y; Minimum Order Quantity: 1; Reeling: True; Supplier Part Number 1: 296-41058-1-ND; Supplier Part Number 2: 595-UCC28720DR
footprint SOIC-7 (SOIC, 8-Leads, Body 5.0x4.0mm (max), Pitch 1.27mm, IPC Medium Density)
pins: 1 VDD "VDD is the bias supply input pin to the controller. A carefully-placed bypass capacitor to GND is required on this pin.", 2 VS "Voltage sense is an input used to provide voltage and timing feedback to the controller.", 3 CBC "Cable compensation is a programming pin for compensation of cable voltage drop. Cable compensation is programmed with a resistor to GND.", 4 GND "The ground pin is both the reference pin for the controller and the low-side return for the drive output.", 5 CS "Current sense input connects to a ground-referenced current-sense resistor in series with the power switch.", 6 DRV "Drive is an output used to drive the base of an external high voltage NPN transistor.", 7 HV "The high-voltage pin connects directly to the rectified bulk voltage and provides charge to the VDD capacitor for start-up of the power supply."


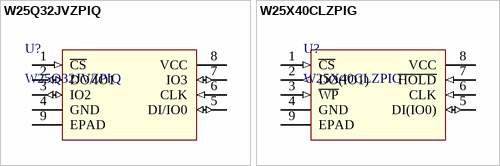
[diagram p58: symbols W25Q32JVZPIQ to W25X40CLZPIG]

## W25Q32JVZPIQ
designator U?
IC FLASH 32MBIT 104MHZ 8WSON; Manufacturer: Winbond Electronics; Memory Type: FLASH - NOR; Memory Size: 32M (4M x 8); Interface: SPI Serial; Voltage - Supply: 2.7 V ~ 3.6 V; Supplier 1: Digi-Key; Supplier Part Number 1: W25Q32JVZPIQ-ND; Manufacturer Part Number: W25Q32JVZPIQ; RoHS: RoHS Compliant; Category: Integrated Circuits (ICs); Stock 1: 8375; Pricing 1: 1=0.7 (USD); Packaging: Tube; Part Status: Active; Memory Format: FLASH; Speed: 104MHz; Operating Temperature: -40°C ~ 85°C (TA); Supplier Device Package: 8-WSON (6x5); ComponentLink1URL: https://www.winbond.com/resource-files/w25q32jv%20spi%20revc%2008302016.pdf; ComponentLink1Description: https://www.winbond.com/resource-files/w25q32jv%20spi%20revc%2008302016.pdf; Package: 8-WDFN Exposed Pad
footprint WSON-8-6x5
pins: 1 ~{CS} (in) "Chip Select Input", 2 DO/IO1 (io) "Data Output (Data Input Output 1)", 3 IO2 (io) "Data Input Output 2", 4 GND (power) "Ground", 5 DI/IO0 (io) "Data Input (Data Input Output 0)", 6 CLK (in) "Serial Clock Input", 7 IO3 (io) "Data Input Output 3", 8 VCC (power) "Power Supply", 9 EPAD

## W25X40CLZPIG
designator U?
IC FLASH 4MBIT 104MHZ 8WSON; Manufacturer: Winbond Electronics; Memory Type: Non-Volatile; Memory Size: 4Mb (512K x 8); Interface: SPI Serial; Voltage - Supply: 2.3 V ~ 3.6 V; Supplier 1: Digi-Key; Supplier Part Number 1: W25X40CLZPIG-ND; Manufacturer Part Number: W25X40CLZPIG; RoHS: RoHS Compliant; Category: Integrated Circuits (ICs); Stock 1: 1365; Pricing 1: 1=0.47 (USD); Packaging: Tube; Part Status: Active; Memory Format: FLASH; Speed: 104MHz; Operating Temperature: -40°C ~ 85°C (TA); Supplier Device Package: 8-WSON (6x5); ComponentLink1URL: https://www.winbond.com/resource-files/w25x40cl_f%2020140325.pdf; ComponentLink1Description: https://www.winbond.com/resource-files/w25x40cl_f%2020140325.pdf; Package: 8-WDFN Exposed Pad
footprint WSON-8-6x5
pins: 1 ~{CS} (in) "Chip Select Input", 2 DO(IO1) (out) "Data Input / Output", 3 ~{WP} (in) "Write Protect Input", 4 GND (power) "Ground", 5 DI(IO0) (io) "Data Input / Output", 6 CLK (in) "Serial Clock Input", 7 ~{HOLD} (in) "Hold Input", 8 VCC (power) "Power Supply", 9 EPAD


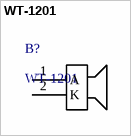
[diagram p59: symbol WT-1201]

## WT-1201
designator B?
AUDIO MAGNETIC XDCR 1-2V TH; Manufacturer: Soberton Inc.; Driver Circuitry: Transducer, Externally Driven; Input Type: Zero-Peak Signal; Voltage - Rated: 1.5V; Voltage Range: 1 ~ 2V; Frequency: 2.4kHz; Operating Mode: Single Tone; Sound Pressure Level: 85dB @ 1.5V, 10cm; Current - Supply: 35mA; Port Location: Top; Ratings: Washable; Supplier 1: Digi-Key; Supplier Part Number 1: 433-1027-ND; Manufacturer Part Number: WT-1201; RoHS: RoHS Compliant; Category: Audio Products; Stock 1: 1917; Pricing 1: 1=0.59, 10=0.504, 25=0.4052, 50=0.36, 100=0.315, 250=0.306, 500=0.297, 1000=0.27, 5000=0.243 (USD); Packaging: Bulk; Part Status: Active; Technology: Magnetic; Duration: -; Operating Temperature: -20°C ~ 60°C; Approvals: -; Mounting Type: Through Hole; Termination: PC Pins; Size / Dimension: 12.0mm Dia x 9.5mm H; Height - Seated (Max): *; ComponentLink1URL: http://www.soberton.com/wp-content/uploads/2012/06/WT-12011.pdf; ComponentLink1Description: http://www.soberton.com/wp-content/uploads/2012/06/WT-12011.pdf
footprint CYLN/D120/H095/LS7.62/BUZZER (DC Buzzer 5V/12V 12.0mm Dia x 9.5mm H, LeadSpace 7.62mm)
pins: 1 A, 2 K